# Altium integrated library Samtec_2,54_mm_Pitch_Socket_Strips.IntLib: 489 symbols (part 1 of 4) (continued)
## BCS-122-F-S-TE
designator J?
Tiger Claw(TM) Pass-Through Socket, Vertical, -55 to 125 degC, 2.54 mm Pitch, 22-Pin, Female, RoHS; Manufacturer: Samtec; PartNumber: BCS-122-F-S-TE; Pitch: 2.54 mm; DatasheetVersion: F-214; PackageVersion: BV, 9/1991; PackageReference: BCS-122-X-S-TE; PackageDescription: Box Connector Socket Strip; Orientation: Vertical; RoHS: True; Temperature Range: -55 to 125 degC; Mounting Technology: Through-hole; ComponentLink1Description: Manufacturer URL; ComponentLink1URL: http://www.samtec.com; ComponentLink2Description: Datasheet; ComponentLink2URL: http://www.samtec.com/documents/webfiles/pdf/BCS.PDF; ComponentLink3Description: Package Specification; ComponentLink3URL: http://www.samtec.com/documents/webfiles/cpdf/BCS-1XX-XXX-X-XX-XXX-MKT.pdf
footprint SMTC-BCS-122-X-S-TE (Box Connector Socket Strip, 1x22 Pins, Vertical, 2.54mm Pitch, Female)
pins: 1, 2, 3, 4, 5, 6, 7, 8, 9, 10, 11, 12, 13, 14, 15, 16, 17, 18, 19, 20, 21, 22

## BCS-122-L-S-TE
designator J?
Tiger Claw(TM) Pass-Through Socket, Vertical, -55 to 125 degC, 2.54 mm Pitch, 22-Pin, Female, RoHS; Manufacturer: Samtec; PartNumber: BCS-122-L-S-TE; Pitch: 2.54 mm; DatasheetVersion: F-214; PackageVersion: BV, 9/1991; PackageReference: BCS-122-X-S-TE; PackageDescription: Box Connector Socket Strip; Supplier 1: Digi-Key; Supplier Part Number 1: SAM1011-22-ND; Supplier 2: Farnell; Supplier Part Number 2: 1667491; Supplier 3: Newark; Supplier Part Number 3: 11P3323; Orientation: Vertical; RoHS: True; Temperature Range: -55 to 125 degC; Mounting Technology: Through-hole; ComponentLink1Description: Manufacturer URL; ComponentLink1URL: http://www.samtec.com; ComponentLink2Description: Datasheet; ComponentLink2URL: http://www.samtec.com/documents/webfiles/pdf/BCS.PDF; ComponentLink3Description: Package Specification; ComponentLink3URL: http://www.samtec.com/documents/webfiles/cpdf/BCS-1XX-XXX-X-XX-XXX-MKT.pdf
footprint SMTC-BCS-122-X-S-TE (Box Connector Socket Strip, 1x22 Pins, Vertical, 2.54mm Pitch, Female)
pins: 1, 2, 3, 4, 5, 6, 7, 8, 9, 10, 11, 12, 13, 14, 15, 16, 17, 18, 19, 20, 21, 22

## BCS-124-F-S-TE
designator J?
Tiger Claw(TM) Pass-Through Socket, Vertical, -55 to 125 degC, 2.54 mm Pitch, 24-Pin, Female, RoHS; Manufacturer: Samtec; PartNumber: BCS-124-F-S-TE; Pitch: 2.54 mm; DatasheetVersion: F-214; PackageVersion: BV, 9/1991; PackageReference: BCS-124-X-S-TE; PackageDescription: Box Connector Socket Strip; Orientation: Vertical; RoHS: True; Temperature Range: -55 to 125 degC; Mounting Technology: Through-hole; ComponentLink1Description: Manufacturer URL; ComponentLink1URL: http://www.samtec.com; ComponentLink2Description: Datasheet; ComponentLink2URL: http://www.samtec.com/documents/webfiles/pdf/BCS.PDF; ComponentLink3Description: Package Specification; ComponentLink3URL: http://www.samtec.com/documents/webfiles/cpdf/BCS-1XX-XXX-X-XX-XXX-MKT.pdf
footprint SMTC-BCS-124-X-S-TE (Box Connector Socket Strip, 1x24 Pins, Vertical, 2.54mm Pitch, Female)
pins: 1, 2, 3, 4, 5, 6, 7, 8, 9, 10, 11, 12, 13, 14, 15, 16, 17, 18, 19, 20, 21, 22, 23, 24

## BCS-124-L-S-TE
designator J?
Tiger Claw(TM) Pass-Through Socket, Vertical, -55 to 125 degC, 2.54 mm Pitch, 24-Pin, Female, RoHS; Manufacturer: Samtec; PartNumber: BCS-124-L-S-TE; Pitch: 2.54 mm; DatasheetVersion: F-214; PackageVersion: BV, 9/1991; PackageReference: BCS-124-X-S-TE; PackageDescription: Box Connector Socket Strip; Supplier 1: Digi-Key; Supplier Part Number 1: SAM1011-24-ND; Supplier 2: Farnell; Supplier Part Number 2: 1667493; Supplier 3: Newark; Supplier Part Number 3: 11P3335; Orientation: Vertical; RoHS: True; Temperature Range: -55 to 125 degC; Mounting Technology: Through-hole; ComponentLink1Description: Manufacturer URL; ComponentLink1URL: http://www.samtec.com; ComponentLink2Description: Datasheet; ComponentLink2URL: http://www.samtec.com/documents/webfiles/pdf/BCS.PDF; ComponentLink3Description: Package Specification; ComponentLink3URL: http://www.samtec.com/documents/webfiles/cpdf/BCS-1XX-XXX-X-XX-XXX-MKT.pdf
footprint SMTC-BCS-124-X-S-TE (Box Connector Socket Strip, 1x24 Pins, Vertical, 2.54mm Pitch, Female)
pins: 1, 2, 3, 4, 5, 6, 7, 8, 9, 10, 11, 12, 13, 14, 15, 16, 17, 18, 19, 20, 21, 22, 23, 24

## BCS-132-F-D-PE
designator J?
Tiger Claw(TM) Pass-Through Socket, Through-hole, Vertical, -55 to 125 degC, 2.54 mm Pitch, 64-Pin, Female, RoHS; Manufacturer: Samtec; PartNumber: BCS-132-F-D-PE; Pitch: 2.54 mm; DatasheetVersion: F-214; PackageVersion: BV, 9/1991; PackageReference: BCS-132-X-D-PE; PackageDescription: Box Connector Socket Strip; Orientation: Vertical; RoHS: True; Temperature Range: -55 to 125 degC; Mounting Technology: Through-hole; ComponentLink1Description: Manufacturer URL; ComponentLink1URL: http://www.samtec.com; ComponentLink2Description: Datasheet; ComponentLink2URL: http://www.samtec.com/documents/webfiles/pdf/BCS.PDF; ComponentLink3Description: Package Specification; ComponentLink3URL: http://www.samtec.com/documents/webfiles/cpdf/BCS-1XX-XXX-X-XX-XXX-MKT.pdf
footprint SMTC-BCS-132-X-D-PE (Box Connector Socket Strip, 2x32 Pins, Vertical, 2.54mm Pitch, Female)
pins: 1, 2, 3, 4, 5, 6, 7, 8, 9, 10, 11, 12, 13, 14, 15, 16, 17, 18, 19, 20, 21, 22, 23, 24, 25, 26, 27, 28, 29, 30, 31, 32, 33, 34, 35, 36, 37, 38, 39, 40, 41, 42, 43, 44, 45, 46, 47, 48, 49, 50, 51, 52, 53, 54, 55, 56, 57, 58, 59, 60, 61, 62, 63, 64

## BCS-132-L-D-PE
designator J?
Tiger Claw(TM) Pass-Through Socket, Through-hole, Vertical, -55 to 125 degC, 2.54 mm Pitch, 64-Pin, Female, RoHS; Manufacturer: Samtec; PartNumber: BCS-132-L-D-PE; Pitch: 2.54 mm; DatasheetVersion: F-214; PackageVersion: BV, 9/1991; PackageReference: BCS-132-X-D-PE; PackageDescription: Box Connector Socket Strip; Supplier 1: Digi-Key; Supplier Part Number 1: SAM1007-32-ND; Supplier 2: Newark; Supplier Part Number 2: 11P3377; Orientation: Vertical; RoHS: True; Temperature Range: -55 to 125 degC; Mounting Technology: Through-hole; ComponentLink1Description: Manufacturer URL; ComponentLink1URL: http://www.samtec.com; ComponentLink2Description: Datasheet; ComponentLink2URL: http://www.samtec.com/documents/webfiles/pdf/BCS.PDF; ComponentLink3Description: Package Specification; ComponentLink3URL: http://www.samtec.com/documents/webfiles/cpdf/BCS-1XX-XXX-X-XX-XXX-MKT.pdf
footprint SMTC-BCS-132-X-D-PE (Box Connector Socket Strip, 2x32 Pins, Vertical, 2.54mm Pitch, Female)
pins: 1, 2, 3, 4, 5, 6, 7, 8, 9, 10, 11, 12, 13, 14, 15, 16, 17, 18, 19, 20, 21, 22, 23, 24, 25, 26, 27, 28, 29, 30, 31, 32, 33, 34, 35, 36, 37, 38, 39, 40, 41, 42, 43, 44, 45, 46, 47, 48, 49, 50, 51, 52, 53, 54, 55, 56, 57, 58, 59, 60, 61, 62, 63, 64

## CES-107-01-L-D
designator J?
Low Profile Socket Strips, Through-hole, Vertical, -55 to 125 degC, 2.54 mm Pitch, 14-Pin, Female, RoHS; Manufacturer: Samtec; PartNumber: CES-107-01-L-D; Pitch: 2.54 mm; DatasheetVersion: F-214; PackageVersion: Y, 9/1992; PackageReference: CES-107-01-X-D; PackageDescription: Closed Entry Socket Strip Double Row Assembly; Orientation: Vertical; RoHS: True; Temperature Range: -55 to 125 degC; Mounting Technology: Through-hole; ComponentLink1Description: Manufacturer URL; ComponentLink1URL: http://www.samtec.com; ComponentLink2Description: Datasheet; ComponentLink2URL: http://www.samtec.com/documents/webfiles/pdf/CES.PDF; ComponentLink3Description: Package Specification; ComponentLink3URL: http://www.samtec.com/documents/webfiles/cpdf/CES-1XX-XX-X-D%20-MKT.pdf
footprint SMTC-CES-107-01-X-D (Closed Entry Socket Strip Double Row Assembly, 2x7 Pins, Vertical, 2.54mm Pitch, Female)
pins: 1, 2, 3, 4, 5, 6, 7, 8, 9, 10, 11, 12, 13, 14

## CES-107-01-T-D
designator J?
Low Profile Socket Strips, Through-hole, Vertical, -55 to 105 degC, 2.54 mm Pitch, 14-Pin, Female, RoHS; Manufacturer: Samtec; PartNumber: CES-107-01-T-D; Pitch: 2.54 mm; DatasheetVersion: F-214; PackageVersion: Y, 9/1992; PackageReference: CES-107-01-X-D; PackageDescription: Closed Entry Socket Strip Double Row Assembly; Supplier 1: Digi-Key; Supplier Part Number 1: SAM1086-07-ND; Supplier 2: Newark; Supplier Part Number 2: 11P3513; Orientation: Vertical; RoHS: True; Temperature Range: -55 to 105 degC; Mounting Technology: Through-hole; ComponentLink1Description: Manufacturer URL; ComponentLink1URL: http://www.samtec.com; ComponentLink2Description: Datasheet; ComponentLink2URL: http://www.samtec.com/documents/webfiles/pdf/CES.PDF; ComponentLink3Description: Package Specification; ComponentLink3URL: http://www.samtec.com/documents/webfiles/cpdf/CES-1XX-XX-X-D%20-MKT.pdf
footprint SMTC-CES-107-01-X-D (Closed Entry Socket Strip Double Row Assembly, 2x7 Pins, Vertical, 2.54mm Pitch, Female)
pins: 1, 2, 3, 4, 5, 6, 7, 8, 9, 10, 11, 12, 13, 14

## CES-120-02-L-D
designator J?
Low Profile Socket Strips, Through-hole, Vertical, -55 to 125 degC, 2.54 mm Pitch, 40-Pin, Female, RoHS; Manufacturer: Samtec; PartNumber: CES-120-02-L-D; Pitch: 2.54 mm; DatasheetVersion: F-214; PackageVersion: Y, 9/1992; PackageReference: CES-120-02-X-D; PackageDescription: Closed Entry Socket Strip Double Row Assembly; Orientation: Vertical; RoHS: True; Temperature Range: -55 to 125 degC; Mounting Technology: Through-hole; ComponentLink1Description: Manufacturer URL; ComponentLink1URL: http://www.samtec.com; ComponentLink2Description: Datasheet; ComponentLink2URL: http://www.samtec.com/documents/webfiles/pdf/CES.PDF; ComponentLink3Description: Package Specification; ComponentLink3URL: http://www.samtec.com/documents/webfiles/cpdf/CES-1XX-XX-X-D%20-MKT.pdf
footprint SMTC-CES-120-02-X-D (Closed Entry Socket Strip Double Row Assembly, 2x20 Pins, Vertical, 2.54mm Pitch, Female)
pins: 1, 2, 3, 4, 5, 6, 7, 8, 9, 10, 11, 12, 13, 14, 15, 16, 17, 18, 19, 20, 21, 22, 23, 24, 25, 26, 27, 28, 29, 30, 31, 32, 33, 34, 35, 36, 37, 38, 39, 40

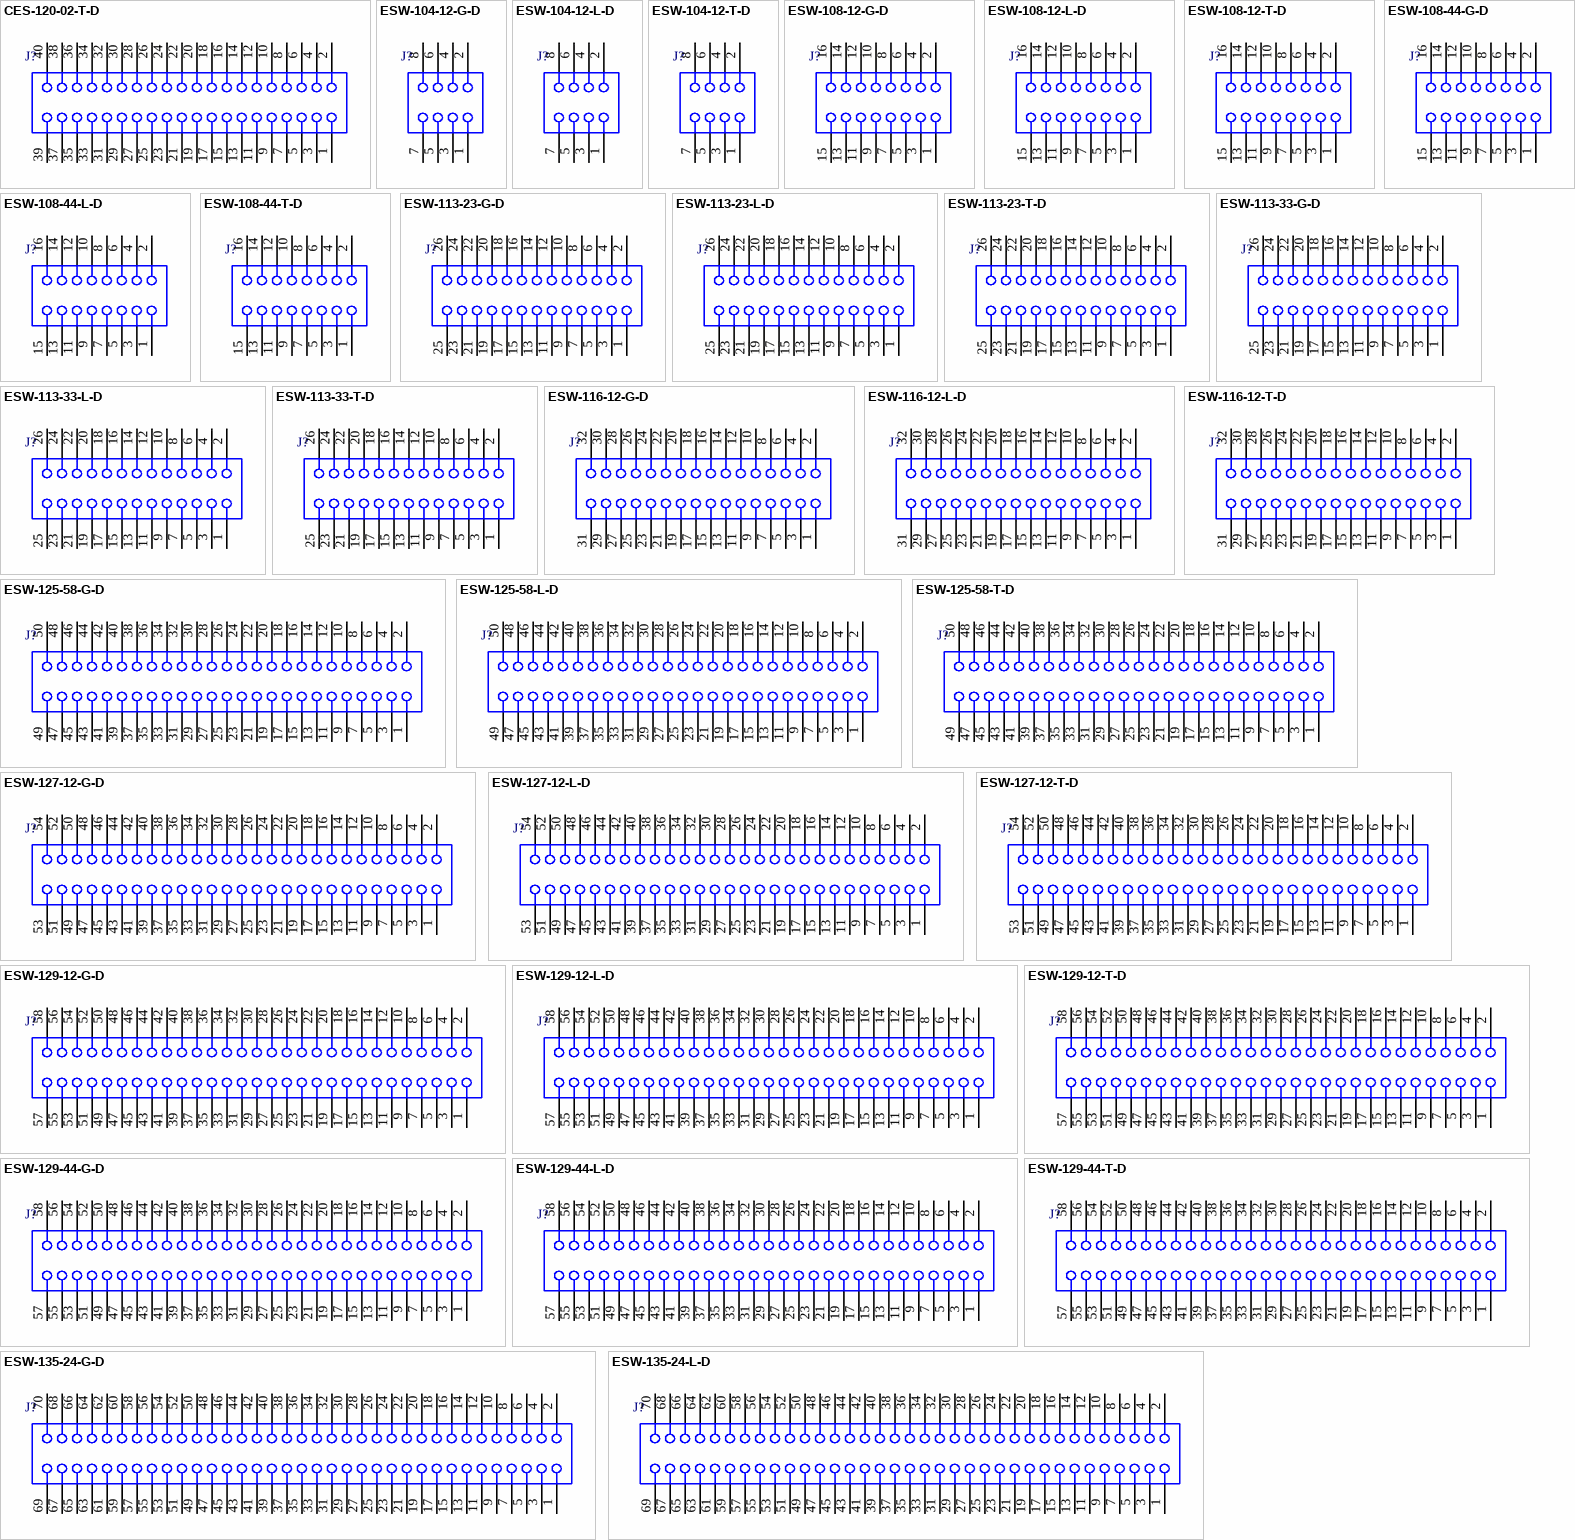
[diagram p1: symbols CES-120-02-T-D to ESW-135-24-L-D]

## CES-120-02-T-D
designator J?
Low Profile Socket Strips, Through-hole, Vertical, -55 to 105 degC, 2.54 mm Pitch, 40-Pin, Female, RoHS; Manufacturer: Samtec; PartNumber: CES-120-02-T-D; Pitch: 2.54 mm; DatasheetVersion: F-214; PackageVersion: Y, 9/1992; PackageReference: CES-120-02-X-D; PackageDescription: Closed Entry Socket Strip Double Row Assembly; Orientation: Vertical; RoHS: True; Temperature Range: -55 to 105 degC; Mounting Technology: Through-hole; ComponentLink1Description: Manufacturer URL; ComponentLink1URL: http://www.samtec.com; ComponentLink2Description: Datasheet; ComponentLink2URL: http://www.samtec.com/documents/webfiles/pdf/CES.PDF; ComponentLink3Description: Package Specification; ComponentLink3URL: http://www.samtec.com/documents/webfiles/cpdf/CES-1XX-XX-X-D%20-MKT.pdf
footprint SMTC-CES-120-02-X-D (Closed Entry Socket Strip Double Row Assembly, 2x20 Pins, Vertical, 2.54mm Pitch, Female)
pins: 1, 2, 3, 4, 5, 6, 7, 8, 9, 10, 11, 12, 13, 14, 15, 16, 17, 18, 19, 20, 21, 22, 23, 24, 25, 26, 27, 28, 29, 30, 31, 32, 33, 34, 35, 36, 37, 38, 39, 40

## ESW-104-12-G-D
designator J?
Elevated Socket, Through-hole, Vertical, -55 to 125 degC, 2.54 mm Pitch, 8-Pin, Female, RoHS; Manufacturer: Samtec; PartNumber: ESW-104-12-G-D; Pitch: 2.54 mm; DatasheetVersion: F-214; PackageVersion: AV, 7/1985; PackageReference: ESW-104-12-X-D; PackageDescription: ESW Strip ASM; Supplier 1: Digi-Key; Supplier Part Number 1: ESW-104-12-G-D-ND; Supplier 2: Newark; Supplier Part Number 2: 98P7738; Orientation: Vertical; RoHS: True; Temperature Range: -55 to 125 degC; Mounting Technology: Through-hole; ComponentLink1Description: Manufacturer URL; ComponentLink1URL: http://www.samtec.com; ComponentLink2Description: Datasheet; ComponentLink2URL: http://www.samtec.com/documents/webfiles/pdf/ESW_TH.PDF; ComponentLink3Description: Package Specification; ComponentLink3URL: http://www.samtec.com/documents/webfiles/cpdf/ESW-1XX-XX-X-X-XX-XX-MKT.pdf
footprint SMTC-ESW-104-12-X-D (Elevated Socket, 2x4 Pins, Vertical, 2.54mm Pitch, Female)
pins: 1, 2, 3, 4, 5, 6, 7, 8

## ESW-104-12-L-D
designator J?
Elevated Socket, Through-hole, Vertical, -55 to 125 degC, 2.54 mm Pitch, 8-Pin, Female, RoHS; Manufacturer: Samtec; PartNumber: ESW-104-12-L-D; Pitch: 2.54 mm; DatasheetVersion: F-214; PackageVersion: AV, 7/1985; PackageReference: ESW-104-12-X-D; PackageDescription: ESW Strip ASM; Orientation: Vertical; RoHS: True; Temperature Range: -55 to 125 degC; Mounting Technology: Through-hole; ComponentLink1Description: Manufacturer URL; ComponentLink1URL: http://www.samtec.com; ComponentLink2Description: Datasheet; ComponentLink2URL: http://www.samtec.com/documents/webfiles/pdf/ESW_TH.PDF; ComponentLink3Description: Package Specification; ComponentLink3URL: http://www.samtec.com/documents/webfiles/cpdf/ESW-1XX-XX-X-X-XX-XX-MKT.pdf
footprint SMTC-ESW-104-12-X-D (Elevated Socket, 2x4 Pins, Vertical, 2.54mm Pitch, Female)
pins: 1, 2, 3, 4, 5, 6, 7, 8

## ESW-104-12-T-D
designator J?
Elevated Socket, Through-hole, Vertical, -55 to 105 degC, 2.54 mm Pitch, 8-Pin, Female, RoHS; Manufacturer: Samtec; PartNumber: ESW-104-12-T-D; Pitch: 2.54 mm; DatasheetVersion: F-214; PackageVersion: AV, 7/1985; PackageReference: ESW-104-12-X-D; PackageDescription: ESW Strip ASM; Orientation: Vertical; RoHS: True; Temperature Range: -55 to 105 degC; Mounting Technology: Through-hole; ComponentLink1Description: Manufacturer URL; ComponentLink1URL: http://www.samtec.com; ComponentLink2Description: Datasheet; ComponentLink2URL: http://www.samtec.com/documents/webfiles/pdf/ESW_TH.PDF; ComponentLink3Description: Package Specification; ComponentLink3URL: http://www.samtec.com/documents/webfiles/cpdf/ESW-1XX-XX-X-X-XX-XX-MKT.pdf
footprint SMTC-ESW-104-12-X-D (Elevated Socket, 2x4 Pins, Vertical, 2.54mm Pitch, Female)
pins: 1, 2, 3, 4, 5, 6, 7, 8

## ESW-108-12-G-D
designator J?
Elevated Socket, Through-hole, Vertical, -55 to 125 degC, 2.54 mm Pitch, 16-Pin, Female, RoHS; Manufacturer: Samtec; PartNumber: ESW-108-12-G-D; Pitch: 2.54 mm; DatasheetVersion: F-214; PackageVersion: AV, 7/1985; PackageReference: ESW-108-12-X-D; PackageDescription: ESW Strip ASM; Supplier 1: Digi-Key; Supplier Part Number 1: ESW-108-12-G-D-ND; Supplier 2: Newark; Supplier Part Number 2: 98P8233; Orientation: Vertical; RoHS: True; Temperature Range: -55 to 125 degC; Mounting Technology: Through-hole; ComponentLink1Description: Manufacturer URL; ComponentLink1URL: http://www.samtec.com; ComponentLink2Description: Datasheet; ComponentLink2URL: http://www.samtec.com/documents/webfiles/pdf/ESW_TH.PDF; ComponentLink3Description: Package Specification; ComponentLink3URL: http://www.samtec.com/documents/webfiles/cpdf/ESW-1XX-XX-X-X-XX-XX-MKT.pdf
footprint SMTC-ESW-108-12-X-D (Elevated Socket, 2x8 Pins, Vertical, 2.54mm Pitch, Female)
pins: 1, 2, 3, 4, 5, 6, 7, 8, 9, 10, 11, 12, 13, 14, 15, 16

## ESW-108-12-L-D
designator J?
Elevated Socket, Through-hole, Vertical, -55 to 125 degC, 2.54 mm Pitch, 16-Pin, Female, RoHS; Manufacturer: Samtec; PartNumber: ESW-108-12-L-D; Pitch: 2.54 mm; DatasheetVersion: F-214; PackageVersion: AV, 7/1985; PackageReference: ESW-108-12-X-D; PackageDescription: ESW Strip ASM; Orientation: Vertical; RoHS: True; Temperature Range: -55 to 125 degC; Mounting Technology: Through-hole; ComponentLink1Description: Manufacturer URL; ComponentLink1URL: http://www.samtec.com; ComponentLink2Description: Datasheet; ComponentLink2URL: http://www.samtec.com/documents/webfiles/pdf/ESW_TH.PDF; ComponentLink3Description: Package Specification; ComponentLink3URL: http://www.samtec.com/documents/webfiles/cpdf/ESW-1XX-XX-X-X-XX-XX-MKT.pdf
footprint SMTC-ESW-108-12-X-D (Elevated Socket, 2x8 Pins, Vertical, 2.54mm Pitch, Female)
pins: 1, 2, 3, 4, 5, 6, 7, 8, 9, 10, 11, 12, 13, 14, 15, 16

## ESW-108-12-T-D
designator J?
Elevated Socket, Through-hole, Vertical, -55 to 105 degC, 2.54 mm Pitch, 16-Pin, Female, RoHS; Manufacturer: Samtec; PartNumber: ESW-108-12-T-D; Pitch: 2.54 mm; DatasheetVersion: F-214; PackageVersion: AV, 7/1985; PackageReference: ESW-108-12-X-D; PackageDescription: ESW Strip ASM; Supplier 1: Newark; Supplier Part Number 1: 98P8245; Orientation: Vertical; RoHS: True; Temperature Range: -55 to 105 degC; Mounting Technology: Through-hole; ComponentLink1Description: Manufacturer URL; ComponentLink1URL: http://www.samtec.com; ComponentLink2Description: Datasheet; ComponentLink2URL: http://www.samtec.com/documents/webfiles/pdf/ESW_TH.PDF; ComponentLink3Description: Package Specification; ComponentLink3URL: http://www.samtec.com/documents/webfiles/cpdf/ESW-1XX-XX-X-X-XX-XX-MKT.pdf
footprint SMTC-ESW-108-12-X-D (Elevated Socket, 2x8 Pins, Vertical, 2.54mm Pitch, Female)
pins: 1, 2, 3, 4, 5, 6, 7, 8, 9, 10, 11, 12, 13, 14, 15, 16

## ESW-108-44-G-D
designator J?
Elevated Socket, Through-hole, Vertical, -55 to 125 degC, 2.54 mm Pitch, 16-Pin, Female, RoHS; Manufacturer: Samtec; PartNumber: ESW-108-44-G-D; Pitch: 2.54 mm; DatasheetVersion: F-214; PackageVersion: AV, 7/1985; PackageReference: ESW-108-44-X-D; PackageDescription: ESW Strip ASM; Orientation: Vertical; RoHS: True; Temperature Range: -55 to 125 degC; Mounting Technology: Through-hole; ComponentLink1Description: Manufacturer URL; ComponentLink1URL: http://www.samtec.com; ComponentLink2Description: Datasheet; ComponentLink2URL: http://www.samtec.com/documents/webfiles/pdf/ESW_TH.PDF; ComponentLink3Description: Package Specification; ComponentLink3URL: http://www.samtec.com/documents/webfiles/cpdf/ESW-1XX-XX-X-X-XX-XX-MKT.pdf
footprint SMTC-ESW-108-44-X-D (Elevated Socket, 2x8 Pins, Vertical, 2.54mm Pitch, Female)
pins: 1, 2, 3, 4, 5, 6, 7, 8, 9, 10, 11, 12, 13, 14, 15, 16

## ESW-108-44-L-D
designator J?
Elevated Socket, Through-hole, Vertical, -55 to 125 degC, 2.54 mm Pitch, 16-Pin, Female, RoHS; Manufacturer: Samtec; PartNumber: ESW-108-44-L-D; Pitch: 2.54 mm; DatasheetVersion: F-214; PackageVersion: AV, 7/1985; PackageReference: ESW-108-44-X-D; PackageDescription: ESW Strip ASM; Orientation: Vertical; RoHS: True; Temperature Range: -55 to 125 degC; Mounting Technology: Through-hole; ComponentLink1Description: Manufacturer URL; ComponentLink1URL: http://www.samtec.com; ComponentLink2Description: Datasheet; ComponentLink2URL: http://www.samtec.com/documents/webfiles/pdf/ESW_TH.PDF; ComponentLink3Description: Package Specification; ComponentLink3URL: http://www.samtec.com/documents/webfiles/cpdf/ESW-1XX-XX-X-X-XX-XX-MKT.pdf
footprint SMTC-ESW-108-44-X-D (Elevated Socket, 2x8 Pins, Vertical, 2.54mm Pitch, Female)
pins: 1, 2, 3, 4, 5, 6, 7, 8, 9, 10, 11, 12, 13, 14, 15, 16

## ESW-108-44-T-D
designator J?
Elevated Socket, Through-hole, Vertical, -55 to 105 degC, 2.54 mm Pitch, 16-Pin, Female, RoHS; Manufacturer: Samtec; PartNumber: ESW-108-44-T-D; Pitch: 2.54 mm; DatasheetVersion: F-214; PackageVersion: AV, 7/1985; PackageReference: ESW-108-44-X-D; PackageDescription: ESW Strip ASM; Orientation: Vertical; RoHS: True; Temperature Range: -55 to 105 degC; Mounting Technology: Through-hole; ComponentLink1Description: Manufacturer URL; ComponentLink1URL: http://www.samtec.com; ComponentLink2Description: Datasheet; ComponentLink2URL: http://www.samtec.com/documents/webfiles/pdf/ESW_TH.PDF; ComponentLink3Description: Package Specification; ComponentLink3URL: http://www.samtec.com/documents/webfiles/cpdf/ESW-1XX-XX-X-X-XX-XX-MKT.pdf
footprint SMTC-ESW-108-44-X-D (Elevated Socket, 2x8 Pins, Vertical, 2.54mm Pitch, Female)
pins: 1, 2, 3, 4, 5, 6, 7, 8, 9, 10, 11, 12, 13, 14, 15, 16

## ESW-113-23-G-D
designator J?
Elevated Socket, Through-hole, Vertical, -55 to 125 degC, 2.54 mm Pitch, 26-Pin, Female, RoHS; Manufacturer: Samtec; PartNumber: ESW-113-23-G-D; Pitch: 2.54 mm; DatasheetVersion: F-214; PackageVersion: AV, 7/1985; PackageReference: ESW-113-23-X-D; PackageDescription: ESW Strip ASM; Orientation: Vertical; RoHS: True; Temperature Range: -55 to 125 degC; Mounting Technology: Through-hole; ComponentLink1Description: Manufacturer URL; ComponentLink1URL: http://www.samtec.com; ComponentLink2Description: Datasheet; ComponentLink2URL: http://www.samtec.com/documents/webfiles/pdf/ESW_TH.PDF; ComponentLink3Description: Package Specification; ComponentLink3URL: http://www.samtec.com/documents/webfiles/cpdf/ESW-1XX-XX-X-X-XX-XX-MKT.pdf
footprint SMTC-ESW-113-23-X-D (Elevated Socket, 2x13 Pins, Vertical, 2.54mm Pitch, Female)
pins: 1, 2, 3, 4, 5, 6, 7, 8, 9, 10, 11, 12, 13, 14, 15, 16, 17, 18, 19, 20, 21, 22, 23, 24, 25, 26

## ESW-113-23-L-D
designator J?
Elevated Socket, Through-hole, Vertical, -55 to 125 degC, 2.54 mm Pitch, 26-Pin, Female, RoHS; Manufacturer: Samtec; PartNumber: ESW-113-23-L-D; Pitch: 2.54 mm; DatasheetVersion: F-214; PackageVersion: AV, 7/1985; PackageReference: ESW-113-23-X-D; PackageDescription: ESW Strip ASM; Orientation: Vertical; RoHS: True; Temperature Range: -55 to 125 degC; Mounting Technology: Through-hole; ComponentLink1Description: Manufacturer URL; ComponentLink1URL: http://www.samtec.com; ComponentLink2Description: Datasheet; ComponentLink2URL: http://www.samtec.com/documents/webfiles/pdf/ESW_TH.PDF; ComponentLink3Description: Package Specification; ComponentLink3URL: http://www.samtec.com/documents/webfiles/cpdf/ESW-1XX-XX-X-X-XX-XX-MKT.pdf
footprint SMTC-ESW-113-23-X-D (Elevated Socket, 2x13 Pins, Vertical, 2.54mm Pitch, Female)
pins: 1, 2, 3, 4, 5, 6, 7, 8, 9, 10, 11, 12, 13, 14, 15, 16, 17, 18, 19, 20, 21, 22, 23, 24, 25, 26

## ESW-113-23-T-D
designator J?
Elevated Socket, Through-hole, Vertical, -55 to 105 degC, 2.54 mm Pitch, 26-Pin, Female, RoHS; Manufacturer: Samtec; PartNumber: ESW-113-23-T-D; Pitch: 2.54 mm; DatasheetVersion: F-214; PackageVersion: AV, 7/1985; PackageReference: ESW-113-23-X-D; PackageDescription: ESW Strip ASM; Orientation: Vertical; RoHS: True; Temperature Range: -55 to 105 degC; Mounting Technology: Through-hole; ComponentLink1Description: Manufacturer URL; ComponentLink1URL: http://www.samtec.com; ComponentLink2Description: Datasheet; ComponentLink2URL: http://www.samtec.com/documents/webfiles/pdf/ESW_TH.PDF; ComponentLink3Description: Package Specification; ComponentLink3URL: http://www.samtec.com/documents/webfiles/cpdf/ESW-1XX-XX-X-X-XX-XX-MKT.pdf
footprint SMTC-ESW-113-23-X-D (Elevated Socket, 2x13 Pins, Vertical, 2.54mm Pitch, Female)
pins: 1, 2, 3, 4, 5, 6, 7, 8, 9, 10, 11, 12, 13, 14, 15, 16, 17, 18, 19, 20, 21, 22, 23, 24, 25, 26

## ESW-113-33-G-D
designator J?
Elevated Socket, Through-hole, Vertical, -55 to 125 degC, 2.54 mm Pitch, 26-Pin, Female, RoHS; Manufacturer: Samtec; PartNumber: ESW-113-33-G-D; Pitch: 2.54 mm; DatasheetVersion: F-214; PackageVersion: AV, 7/1985; PackageReference: ESW-113-33-X-D; PackageDescription: ESW Strip ASM; Supplier 1: Digi-Key; Supplier Part Number 1: ESW-113-33-G-D-ND; Orientation: Vertical; RoHS: True; Temperature Range: -55 to 125 degC; Mounting Technology: Through-hole; ComponentLink1Description: Manufacturer URL; ComponentLink1URL: http://www.samtec.com; ComponentLink2Description: Datasheet; ComponentLink2URL: http://www.samtec.com/documents/webfiles/pdf/ESW_TH.PDF; ComponentLink3Description: Package Specification; ComponentLink3URL: http://www.samtec.com/documents/webfiles/cpdf/ESW-1XX-XX-X-X-XX-XX-MKT.pdf
footprint SMTC-ESW-113-33-X-D (Elevated Socket, 2x13 Pins, Vertical, 2.54mm Pitch, Female)
pins: 1, 2, 3, 4, 5, 6, 7, 8, 9, 10, 11, 12, 13, 14, 15, 16, 17, 18, 19, 20, 21, 22, 23, 24, 25, 26

## ESW-113-33-L-D
designator J?
Elevated Socket, Through-hole, Vertical, -55 to 125 degC, 2.54 mm Pitch, 26-Pin, Female, RoHS; Manufacturer: Samtec; PartNumber: ESW-113-33-L-D; Pitch: 2.54 mm; DatasheetVersion: F-214; PackageVersion: AV, 7/1985; PackageReference: ESW-113-33-X-D; PackageDescription: ESW Strip ASM; Orientation: Vertical; RoHS: True; Temperature Range: -55 to 125 degC; Mounting Technology: Through-hole; ComponentLink1Description: Manufacturer URL; ComponentLink1URL: http://www.samtec.com; ComponentLink2Description: Datasheet; ComponentLink2URL: http://www.samtec.com/documents/webfiles/pdf/ESW_TH.PDF; ComponentLink3Description: Package Specification; ComponentLink3URL: http://www.samtec.com/documents/webfiles/cpdf/ESW-1XX-XX-X-X-XX-XX-MKT.pdf
footprint SMTC-ESW-113-33-X-D (Elevated Socket, 2x13 Pins, Vertical, 2.54mm Pitch, Female)
pins: 1, 2, 3, 4, 5, 6, 7, 8, 9, 10, 11, 12, 13, 14, 15, 16, 17, 18, 19, 20, 21, 22, 23, 24, 25, 26

## ESW-113-33-T-D
designator J?
Elevated Socket, Through-hole, Vertical, -55 to 105 degC, 2.54 mm Pitch, 26-Pin, Female, RoHS; Manufacturer: Samtec; PartNumber: ESW-113-33-T-D; Pitch: 2.54 mm; DatasheetVersion: F-214; PackageVersion: AV, 7/1985; PackageReference: ESW-113-33-X-D; PackageDescription: ESW Strip ASM; Orientation: Vertical; RoHS: True; Temperature Range: -55 to 105 degC; Mounting Technology: Through-hole; ComponentLink1Description: Manufacturer URL; ComponentLink1URL: http://www.samtec.com; ComponentLink2Description: Datasheet; ComponentLink2URL: http://www.samtec.com/documents/webfiles/pdf/ESW_TH.PDF; ComponentLink3Description: Package Specification; ComponentLink3URL: http://www.samtec.com/documents/webfiles/cpdf/ESW-1XX-XX-X-X-XX-XX-MKT.pdf
footprint SMTC-ESW-113-33-X-D (Elevated Socket, 2x13 Pins, Vertical, 2.54mm Pitch, Female)
pins: 1, 2, 3, 4, 5, 6, 7, 8, 9, 10, 11, 12, 13, 14, 15, 16, 17, 18, 19, 20, 21, 22, 23, 24, 25, 26

## ESW-116-12-G-D
designator J?
Elevated Socket, Through-hole, Vertical, -55 to 125 degC, 2.54 mm Pitch, 32-Pin, Female, RoHS; Manufacturer: Samtec; PartNumber: ESW-116-12-G-D; Pitch: 2.54 mm; DatasheetVersion: F-214; PackageVersion: AV, 7/1985; PackageReference: ESW-116-12-X-D; PackageDescription: ESW Strip ASM; Orientation: Vertical; RoHS: True; Temperature Range: -55 to 125 degC; Mounting Technology: Through-hole; ComponentLink1Description: Manufacturer URL; ComponentLink1URL: http://www.samtec.com; ComponentLink2Description: Datasheet; ComponentLink2URL: http://www.samtec.com/documents/webfiles/pdf/ESW_TH.PDF; ComponentLink3Description: Package Specification; ComponentLink3URL: http://www.samtec.com/documents/webfiles/cpdf/ESW-1XX-XX-X-X-XX-XX-MKT.pdf
footprint SMTC-ESW-116-12-X-D (Elevated Socket, 2x16 Pins, Vertical, 2.54mm Pitch, Female)
pins: 1, 2, 3, 4, 5, 6, 7, 8, 9, 10, 11, 12, 13, 14, 15, 16, 17, 18, 19, 20, 21, 22, 23, 24, 25, 26, 27, 28, 29, 30, 31, 32

## ESW-116-12-L-D
designator J?
Elevated Socket, Through-hole, Vertical, -55 to 125 degC, 2.54 mm Pitch, 32-Pin, Female, RoHS; Manufacturer: Samtec; PartNumber: ESW-116-12-L-D; Pitch: 2.54 mm; DatasheetVersion: F-214; PackageVersion: AV, 7/1985; PackageReference: ESW-116-12-X-D; PackageDescription: ESW Strip ASM; Orientation: Vertical; RoHS: True; Temperature Range: -55 to 125 degC; Mounting Technology: Through-hole; ComponentLink1Description: Manufacturer URL; ComponentLink1URL: http://www.samtec.com; ComponentLink2Description: Datasheet; ComponentLink2URL: http://www.samtec.com/documents/webfiles/pdf/ESW_TH.PDF; ComponentLink3Description: Package Specification; ComponentLink3URL: http://www.samtec.com/documents/webfiles/cpdf/ESW-1XX-XX-X-X-XX-XX-MKT.pdf
footprint SMTC-ESW-116-12-X-D (Elevated Socket, 2x16 Pins, Vertical, 2.54mm Pitch, Female)
pins: 1, 2, 3, 4, 5, 6, 7, 8, 9, 10, 11, 12, 13, 14, 15, 16, 17, 18, 19, 20, 21, 22, 23, 24, 25, 26, 27, 28, 29, 30, 31, 32

## ESW-116-12-T-D
designator J?
Elevated Socket, Through-hole, Vertical, -55 to 105 degC, 2.54 mm Pitch, 32-Pin, Female, RoHS; Manufacturer: Samtec; PartNumber: ESW-116-12-T-D; Pitch: 2.54 mm; DatasheetVersion: F-214; PackageVersion: AV, 7/1985; PackageReference: ESW-116-12-X-D; PackageDescription: ESW Strip ASM; Orientation: Vertical; RoHS: True; Temperature Range: -55 to 105 degC; Mounting Technology: Through-hole; ComponentLink1Description: Manufacturer URL; ComponentLink1URL: http://www.samtec.com; ComponentLink2Description: Datasheet; ComponentLink2URL: http://www.samtec.com/documents/webfiles/pdf/ESW_TH.PDF; ComponentLink3Description: Package Specification; ComponentLink3URL: http://www.samtec.com/documents/webfiles/cpdf/ESW-1XX-XX-X-X-XX-XX-MKT.pdf
footprint SMTC-ESW-116-12-X-D (Elevated Socket, 2x16 Pins, Vertical, 2.54mm Pitch, Female)
pins: 1, 2, 3, 4, 5, 6, 7, 8, 9, 10, 11, 12, 13, 14, 15, 16, 17, 18, 19, 20, 21, 22, 23, 24, 25, 26, 27, 28, 29, 30, 31, 32

## ESW-125-58-G-D
designator J?
Elevated Socket, Through-hole, Vertical, -55 to 125 degC, 2.54 mm Pitch, 50-Pin, Female, RoHS; Manufacturer: Samtec; PartNumber: ESW-125-58-G-D; Pitch: 2.54 mm; DatasheetVersion: F-214; PackageVersion: AV, 7/1985; PackageReference: ESW-125-58-X-D; PackageDescription: ESW Strip ASM; Supplier 1: Newark; Supplier Part Number 1: 98P9770; Orientation: Vertical; RoHS: True; Temperature Range: -55 to 125 degC; Mounting Technology: Through-hole; ComponentLink1Description: Manufacturer URL; ComponentLink1URL: http://www.samtec.com; ComponentLink2Description: Datasheet; ComponentLink2URL: http://www.samtec.com/documents/webfiles/pdf/ESW_TH.PDF; ComponentLink3Description: Package Specification; ComponentLink3URL: http://www.samtec.com/documents/webfiles/cpdf/ESW-1XX-XX-X-X-XX-XX-MKT.pdf
footprint SMTC-ESW-125-58-X-D (Elevated Socket, 2x25 Pins, Vertical, 2.54mm Pitch, Female)
pins: 1, 2, 3, 4, 5, 6, 7, 8, 9, 10, 11, 12, 13, 14, 15, 16, 17, 18, 19, 20, 21, 22, 23, 24, 25, 26, 27, 28, 29, 30, 31, 32, 33, 34, 35, 36, 37, 38, 39, 40, 41, 42, 43, 44, 45, 46, 47, 48, 49, 50

## ESW-125-58-L-D
designator J?
Elevated Socket, Through-hole, Vertical, -55 to 125 degC, 2.54 mm Pitch, 50-Pin, Female, RoHS; Manufacturer: Samtec; PartNumber: ESW-125-58-L-D; Pitch: 2.54 mm; DatasheetVersion: F-214; PackageVersion: AV, 7/1985; PackageReference: ESW-125-58-X-D; PackageDescription: ESW Strip ASM; Orientation: Vertical; RoHS: True; Temperature Range: -55 to 125 degC; Mounting Technology: Through-hole; ComponentLink1Description: Manufacturer URL; ComponentLink1URL: http://www.samtec.com; ComponentLink2Description: Datasheet; ComponentLink2URL: http://www.samtec.com/documents/webfiles/pdf/ESW_TH.PDF; ComponentLink3Description: Package Specification; ComponentLink3URL: http://www.samtec.com/documents/webfiles/cpdf/ESW-1XX-XX-X-X-XX-XX-MKT.pdf
footprint SMTC-ESW-125-58-X-D (Elevated Socket, 2x25 Pins, Vertical, 2.54mm Pitch, Female)
pins: 1, 2, 3, 4, 5, 6, 7, 8, 9, 10, 11, 12, 13, 14, 15, 16, 17, 18, 19, 20, 21, 22, 23, 24, 25, 26, 27, 28, 29, 30, 31, 32, 33, 34, 35, 36, 37, 38, 39, 40, 41, 42, 43, 44, 45, 46, 47, 48, 49, 50

## ESW-125-58-T-D
designator J?
Elevated Socket, Through-hole, Vertical, -55 to 105 degC, 2.54 mm Pitch, 50-Pin, Female, RoHS; Manufacturer: Samtec; PartNumber: ESW-125-58-T-D; Pitch: 2.54 mm; DatasheetVersion: F-214; PackageVersion: AV, 7/1985; PackageReference: ESW-125-58-X-D; PackageDescription: ESW Strip ASM; Orientation: Vertical; RoHS: True; Temperature Range: -55 to 105 degC; Mounting Technology: Through-hole; ComponentLink1Description: Manufacturer URL; ComponentLink1URL: http://www.samtec.com; ComponentLink2Description: Datasheet; ComponentLink2URL: http://www.samtec.com/documents/webfiles/pdf/ESW_TH.PDF; ComponentLink3Description: Package Specification; ComponentLink3URL: http://www.samtec.com/documents/webfiles/cpdf/ESW-1XX-XX-X-X-XX-XX-MKT.pdf
footprint SMTC-ESW-125-58-X-D (Elevated Socket, 2x25 Pins, Vertical, 2.54mm Pitch, Female)
pins: 1, 2, 3, 4, 5, 6, 7, 8, 9, 10, 11, 12, 13, 14, 15, 16, 17, 18, 19, 20, 21, 22, 23, 24, 25, 26, 27, 28, 29, 30, 31, 32, 33, 34, 35, 36, 37, 38, 39, 40, 41, 42, 43, 44, 45, 46, 47, 48, 49, 50

## ESW-127-12-G-D
designator J?
Elevated Socket, Through-hole, Vertical, -55 to 125 degC, 2.54 mm Pitch, 54-Pin, Female, RoHS; Manufacturer: Samtec; PartNumber: ESW-127-12-G-D; Pitch: 2.54 mm; DatasheetVersion: F-214; PackageVersion: AV, 7/1985; PackageReference: ESW-127-12-X-D; PackageDescription: ESW Strip ASM; Orientation: Vertical; RoHS: True; Temperature Range: -55 to 125 degC; Mounting Technology: Through-hole; ComponentLink1Description: Manufacturer URL; ComponentLink1URL: http://www.samtec.com; ComponentLink2Description: Datasheet; ComponentLink2URL: http://www.samtec.com/documents/webfiles/pdf/ESW_TH.PDF; ComponentLink3Description: Package Specification; ComponentLink3URL: http://www.samtec.com/documents/webfiles/cpdf/ESW-1XX-XX-X-X-XX-XX-MKT.pdf
footprint SMTC-ESW-127-12-X-D (Elevated Socket, 2x27 Pins, Vertical, 2.54mm Pitch, Female)
pins: 1, 2, 3, 4, 5, 6, 7, 8, 9, 10, 11, 12, 13, 14, 15, 16, 17, 18, 19, 20, 21, 22, 23, 24, 25, 26, 27, 28, 29, 30, 31, 32, 33, 34, 35, 36, 37, 38, 39, 40, 41, 42, 43, 44, 45, 46, 47, 48, 49, 50, 51, 52, 53, 54
